# Altium footprint library Pin Header WR-PHD_2.00mm.PcbLib: 63 footprints (part 4 of 4)
Each footprint in its own frame and in the unit in brackets; x right, y up, seen from the top. Pads: shape width x height; smd on the part's side, far side on the other; paste and mask are expansions set on the pad; w line width, h text height; cw(c..) or ccw(c..) is an arc to the next point about the centre after c.
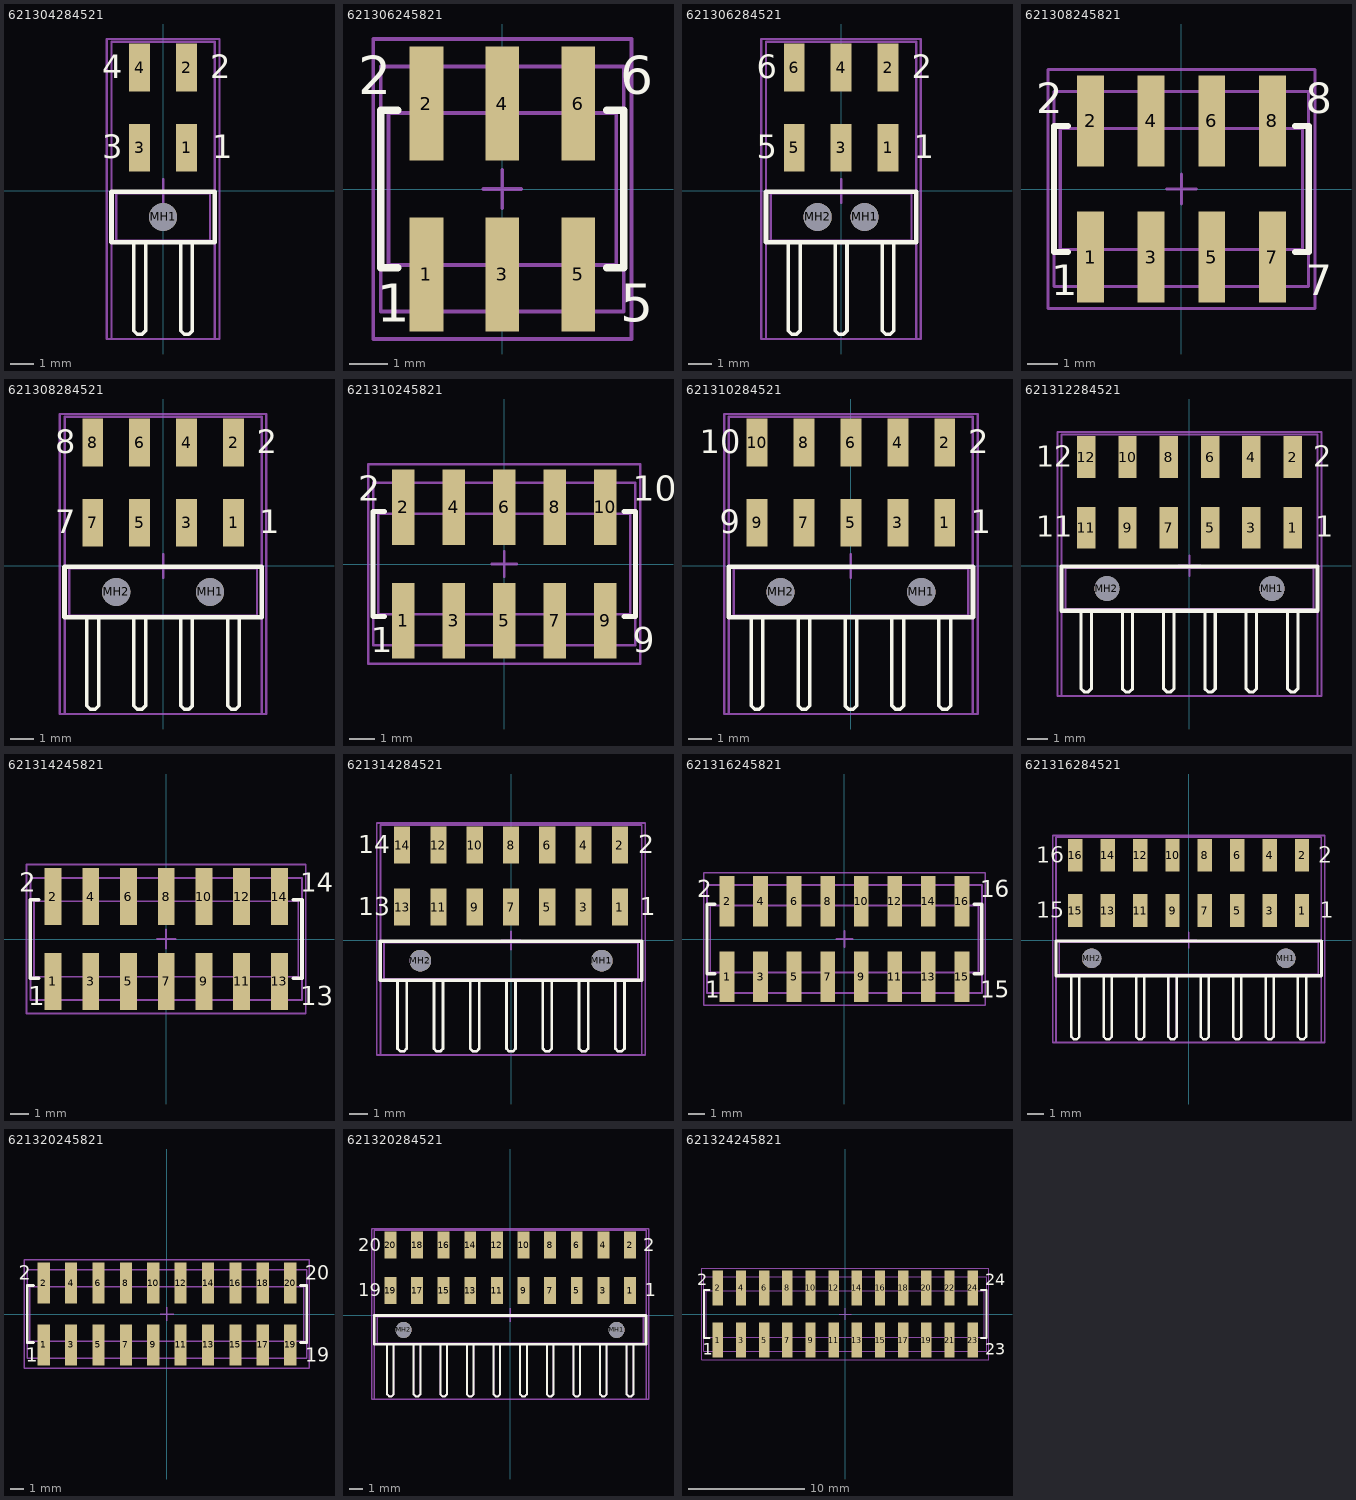
[diagram p3: the footprints below, top view; thin cyan lines are the x and y axes]

## 621304284521 [mm] "Pin Header, pitch 2.00 mm, SMD, Angled, dual row, 4p"
height 5.5
pads (5):
  rect 0.89x2.03 smd: 1(1,1.84) 2(1,5.26) 3(-1,1.84) 4(-1,5.26)
  round 1.2 hole 1.2 unplated: MH1(0,-1.11)
Top Overlay:
  lines w0.15: -1.25,-2.185 -1.25,-5.61 -1.25,-5.86 -1.25,-5.96 -1.1,-6.11 -0.9,-6.11 -0.75,-5.96 -0.75,-5.86 -0.75,-5.61 -0.75,-2.185 ; 0.75,-2.185 0.75,-5.61 0.75,-5.86 0.75,-5.96 0.9,-6.11 1.1,-6.11 1.25,-5.96 1.25,-5.86 1.25,-5.61 1.25,-2.185
  lines w0.2: -2.2,-2.185 -2.2,-0.035 2.2,-0.035 2.2,-2.185 -2.2,-2.185
  text "1" at 2.1,1.4 h1
  text "3" at -2.6,1.4 h1
  text "2" at 2,4.8 h1
  text "4" at -2.6,4.8 h1
Mechanical 11:
  lines w0.1: -1.25,-2.11 -1.25,-5.61 -1.25,-5.86 -1.25,-5.96 -1.1,-6.11 -0.9,-6.11 -0.75,-5.96 -0.75,-5.86 -0.75,-5.61 -0.75,-2.11 ; 0.75,-2.11 0.75,-5.61 0.75,-5.86 0.75,-5.96 0.9,-6.11 1.1,-6.11 1.25,-5.96 1.25,-5.86 1.25,-5.61 1.25,-2.11 ; -2,-2.11 2,-2.11 2,-0.11 -2,-0.11 -2,-2.11
Mechanical 13:
  lines w0.1: -2.2,-6.31 2.2,-6.31 2.2,6.36 -2.2,6.36 -2.2,-6.31
Mechanical 15:
  lines w0.1: -0.5,0 0.5,0 ; 0,-0.5 0,0.5 ; -2.4,-6.31 -2.4,6.475 2.4,6.475 2.4,-6.31 -2.4,-6.31
3D body "621304284521.stp": height 5.52, standoff -0.98, extent -3.75,-6.11 3.75,6.11

## 621306245821 [mm] "2.00 mm SMT Dual Pin Header Low Profile (Reel), 6p"
height 4.7
pads (6):
  rect 0.89x3 smd: 1(-2,-2.25) 2(-2,2.25) 3(0,-2.25) 4(0,2.25) 5(2,-2.25) 6(2,2.25)
Top Overlay:
  lines w0.2: -2.75,-2.075 -3.2,-2.075 -3.2,2.075 -2.75,2.075 ; 2.75,-2.075 3.2,-2.075 3.2,2.075 2.75,2.075
  text "5" at 3.1,-3.5 h1
  text "6" at 3.1,2.5 h1
  text "2" at -3.8,2.5 h1
  text "1" at -3.3,-3.5 h1
Mechanical 11:
  lines w0.1: -3,-2 -3,2 3,2 3,-2 -3,-2
Mechanical 13:
  lines w0.1: -3.2,-3.225 3.2,-3.225 3.2,3.225 -3.2,3.225 -3.2,-3.225
Mechanical 15:
  lines w0.1: -0.5,0 0.5,0 ; 0,-0.5 0,0.5 ; -3.4,-3.95 3.4,-3.95 3.4,3.95 -3.4,3.95 -3.4,-3.95
3D body "621306245821.stp": height 4.7, standoff 0, extent -3,-3.1 3,3.1

## 621306284521 [mm] "Pin Header, pitch 2.00 mm, SMD, Angled, dual row, 6p"
height 5.5
pads (8):
  rect 0.89x2.03 smd: 1(2,1.84) 2(2,5.26) 3(0,1.84) 4(0,5.26) 5(-2,1.84) 6(-2,5.26)
  round 1.2 hole 1.2 unplated: MH1(1,-1.11) MH2(-1,-1.11)
Top Overlay:
  lines w0.15: -2.25,-2.185 -2.25,-5.61 -2.25,-5.86 -2.25,-5.96 -2.1,-6.11 -1.9,-6.11 -1.75,-5.96 -1.75,-5.86 -1.75,-5.61 -1.75,-2.185 ; -0.25,-2.185 -0.25,-5.61 -0.25,-5.86 -0.25,-5.96 -0.1,-6.11 0.1,-6.11 0.25,-5.96 0.25,-5.86 0.25,-5.61 0.25,-2.185 ; 1.75,-2.185 1.75,-5.61 1.75,-5.86 1.75,-5.96 1.9,-6.11 2.1,-6.11 2.25,-5.96 2.25,-5.86 2.25,-5.61 2.25,-2.185
  lines w0.2: -3.2,-2.185 -3.2,-0.035 3.2,-0.035 3.2,-2.185 -3.2,-2.185
  text "5" at -3.6,1.4 h1
  text "6" at -3.6,4.8 h1
  text "1" at 3.1,1.4 h1
  text "2" at 3,4.8 h1
Mechanical 11:
  lines w0.1: -2.25,-2.11 -2.25,-5.61 -2.25,-5.86 -2.25,-5.96 -2.1,-6.11 -1.9,-6.11 -1.75,-5.96 -1.75,-5.86 -1.75,-5.61 -1.75,-2.11 ; -0.25,-2.11 -0.25,-5.61 -0.25,-5.86 -0.25,-5.96 -0.1,-6.11 0.1,-6.11 0.25,-5.96 0.25,-5.86 0.25,-5.61 0.25,-2.11 ; 1.75,-2.11 1.75,-5.61 1.75,-5.86 1.75,-5.96 1.9,-6.11 2.1,-6.11 2.25,-5.96 2.25,-5.86 2.25,-5.61 2.25,-2.11 ; -3,-2.11 3,-2.11 3,-0.11 -3,-0.11 -3,-2.11
Mechanical 13:
  lines w0.1: -3.2,-6.31 3.2,-6.31 3.2,6.36 -3.2,6.36 -3.2,-6.31
Mechanical 15:
  lines w0.1: -0.5,0 0.5,0 ; 0,-0.5 0,0.5 ; -3.4,-6.31 -3.4,6.475 3.4,6.475 3.4,-6.31 -3.4,-6.31
3D body "621306284521.stp": height 5.52, standoff -0.98, extent -3.75,-6.11 3.75,6.11

## 621308245821 [mm] "2.00 mm SMT Dual Pin Header Low Profile (Reel), 8p"
height 4.7
pads (8):
  rect 0.89x3 smd: 1(-3,-2.25) 2(-3,2.25) 3(-1,-2.25) 4(-1,2.25) 5(1,-2.25) 6(1,2.25) 7(3,-2.25) 8(3,2.25)
Top Overlay:
  lines w0.2: -3.75,-2.075 -4.2,-2.075 -4.2,2.075 -3.75,2.075 ; 3.75,-2.075 4.2,-2.075 4.2,2.075 3.75,2.075
  text "7" at 4.1,-3.5 h1
  text "8" at 4.1,2.5 h1
  text "2" at -4.8,2.5 h1
  text "1" at -4.3,-3.5 h1
Mechanical 11:
  lines w0.1: -4,-2 -4,2 4,2 4,-2 -4,-2
Mechanical 13:
  lines w0.1: -4.2,-3.225 4.2,-3.225 4.2,3.225 -4.2,3.225 -4.2,-3.225
Mechanical 15:
  lines w0.1: -0.5,0 0.5,0 ; 0,-0.5 0,0.5 ; -4.4,-3.95 4.4,-3.95 4.4,3.95 -4.4,3.95 -4.4,-3.95
3D body "621308245821.stp": height 4.7, standoff 0, extent -4,-3.1 4,3.1

## 621308284521 [mm] "Pin Header, pitch 2.00 mm, SMD, Angled, dual row, 8p"
height 5.5
pads (10):
  rect 0.89x2.03 smd: 1(3,1.84) 2(3,5.26) 3(1,1.84) 4(1,5.26) 5(-1,1.84) 6(-1,5.26) 7(-3,1.84) 8(-3,5.26)
  round 1.2 hole 1.2 unplated: MH1(2,-1.11) MH2(-2,-1.11)
Top Overlay:
  lines w0.15: -3.25,-2.185 -3.25,-5.61 -3.25,-5.86 -3.25,-5.96 -3.1,-6.11 -2.9,-6.11 -2.75,-5.96 -2.75,-5.86 -2.75,-5.61 -2.75,-2.185 ; -1.25,-2.185 -1.25,-5.61 -1.25,-5.86 -1.25,-5.96 -1.1,-6.11 -0.9,-6.11 -0.75,-5.96 -0.75,-5.86 -0.75,-5.61 -0.75,-2.185 ; 0.75,-2.185 0.75,-5.61 0.75,-5.86 0.75,-5.96 0.9,-6.11 1.1,-6.11 1.25,-5.96 1.25,-5.86 1.25,-5.61 1.25,-2.185 ; 2.75,-2.185 2.75,-5.61 2.75,-5.86 2.75,-5.96 2.9,-6.11 3.1,-6.11 3.25,-5.96 3.25,-5.86 3.25,-5.61 3.25,-2.185
  lines w0.2: -4.2,-2.185 -4.2,-0.035 4.2,-0.035 4.2,-2.185 -4.2,-2.185
  text "1" at 4.1,1.4 h1
  text "2" at 4,4.8 h1
  text "8" at -4.6,4.8 h1
  text "7" at -4.6,1.4 h1
Mechanical 11:
  lines w0.1: -3.25,-2.11 -3.25,-5.61 -3.25,-5.86 -3.25,-5.96 -3.1,-6.11 -2.9,-6.11 -2.75,-5.96 -2.75,-5.86 -2.75,-5.61 -2.75,-2.11 ; -1.25,-2.11 -1.25,-5.61 -1.25,-5.86 -1.25,-5.96 -1.1,-6.11 -0.9,-6.11 -0.75,-5.96 -0.75,-5.86 -0.75,-5.61 -0.75,-2.11 ; 0.75,-2.11 0.75,-5.61 0.75,-5.86 0.75,-5.96 0.9,-6.11 1.1,-6.11 1.25,-5.96 1.25,-5.86 1.25,-5.61 1.25,-2.11 ; 2.75,-2.11 2.75,-5.61 2.75,-5.86 2.75,-5.96 2.9,-6.11 3.1,-6.11 3.25,-5.96 3.25,-5.86 3.25,-5.61 3.25,-2.11 ; -4,-2.11 4,-2.11 4,-0.11 -4,-0.11 -4,-2.11
Mechanical 13:
  lines w0.1: -4.2,-6.31 4.2,-6.31 4.2,6.36 -4.2,6.36 -4.2,-6.31
Mechanical 15:
  lines w0.1: -0.5,0 0.5,0 ; 0,-0.5 0,0.5 ; -4.4,-6.31 -4.4,6.475 4.4,6.475 4.4,-6.31 -4.4,-6.31
3D body "621308284521.stp": height 5.52, standoff -0.98, extent -4,-6.11 4,6.11

## 621310245821 [mm] "2.00 mm SMT Dual Pin Header Low Profile (Reel), 10p"
height 4.7
pads (10):
  rect 0.89x3 smd: 1(-4,-2.25) 2(-4,2.25) 3(-2,-2.25) 4(-2,2.25) 5(0,-2.25) 6(0,2.25) 7(2,-2.25) 8(2,2.25) 9(4,-2.25) 10(4,2.25)
Top Overlay:
  lines w0.2: -4.75,-2.075 -5.2,-2.075 -5.2,2.075 -4.75,2.075 ; 4.75,-2.075 5.2,-2.075 5.2,2.075 4.75,2.075
  text "2" at -5.8,2.5 h1
  text "1" at -5.3,-3.5 h1
  text "10" at 5.1,2.5 h1
  text "9" at 5.1,-3.5 h1
Mechanical 11:
  lines w0.1: -5,-2 -5,2 5,2 5,-2 -5,-2
Mechanical 13:
  lines w0.1: -5.2,-3.225 5.2,-3.225 5.2,3.225 -5.2,3.225 -5.2,-3.225
Mechanical 15:
  lines w0.1: -0.5,0 0.5,0 ; 0,-0.5 0,0.5 ; -5.4,-3.95 5.4,-3.95 5.4,3.95 -5.4,3.95 -5.4,-3.95
3D body "621310245821.stp": height 4.7, standoff 0, extent -5,-3.1 5,3.1

## 621310284521 [mm] "Pin Header, pitch 2.00 mm, SMD, Angled, dual row, 10p"
height 5.5
pads (12):
  rect 0.89x2.03 smd: 1(4,1.84) 2(4,5.26) 3(2,1.84) 4(2,5.26) 5(0,1.84) 6(0,5.26) 7(-2,1.84) 8(-2,5.26) 9(-4,1.84) 10(-4,5.26)
  round 1.2 hole 1.2 unplated: MH1(3,-1.11) MH2(-3,-1.11)
Top Overlay:
  lines w0.15: -4.25,-2.185 -4.25,-5.61 -4.25,-5.86 -4.25,-5.96 -4.1,-6.11 -3.9,-6.11 -3.75,-5.96 -3.75,-5.86 -3.75,-5.61 -3.75,-2.185 ; -2.25,-2.185 -2.25,-5.61 -2.25,-5.86 -2.25,-5.96 -2.1,-6.11 -1.9,-6.11 -1.75,-5.96 -1.75,-5.86 -1.75,-5.61 -1.75,-2.185 ; -0.25,-2.185 -0.25,-5.61 -0.25,-5.86 -0.25,-5.96 -0.1,-6.11 0.1,-6.11 0.25,-5.96 0.25,-5.86 0.25,-5.61 0.25,-2.185 ; 1.75,-2.185 1.75,-5.61 1.75,-5.86 1.75,-5.96 1.9,-6.11 2.1,-6.11 2.25,-5.96 2.25,-5.86 2.25,-5.61 2.25,-2.185 ; 3.75,-2.185 3.75,-5.61 3.75,-5.86 3.75,-5.96 3.9,-6.11 4.1,-6.11 4.25,-5.96 4.25,-5.86 4.25,-5.61 4.25,-2.185
  lines w0.2: -5.2,-2.185 -5.2,-0.035 5.2,-0.035 5.2,-2.185 -5.2,-2.185
  text "1" at 5.1,1.4 h1
  text "2" at 5,4.8 h1
  text "10" at -6.433,4.8 h1
  text "9" at -5.6,1.4 h1
Mechanical 11:
  lines w0.1: -4.25,-2.11 -4.25,-5.61 -4.25,-5.86 -4.25,-5.96 -4.1,-6.11 -3.9,-6.11 -3.75,-5.96 -3.75,-5.86 -3.75,-5.61 -3.75,-2.11 ; -2.25,-2.11 -2.25,-5.61 -2.25,-5.86 -2.25,-5.96 -2.1,-6.11 -1.9,-6.11 -1.75,-5.96 -1.75,-5.86 -1.75,-5.61 -1.75,-2.11 ; -0.25,-2.11 -0.25,-5.61 -0.25,-5.86 -0.25,-5.96 -0.1,-6.11 0.1,-6.11 0.25,-5.96 0.25,-5.86 0.25,-5.61 0.25,-2.11 ; 1.75,-2.11 1.75,-5.61 1.75,-5.86 1.75,-5.96 1.9,-6.11 2.1,-6.11 2.25,-5.96 2.25,-5.86 2.25,-5.61 2.25,-2.11 ; 3.75,-2.11 3.75,-5.61 3.75,-5.86 3.75,-5.96 3.9,-6.11 4.1,-6.11 4.25,-5.96 4.25,-5.86 4.25,-5.61 4.25,-2.11 ; -5,-2.11 5,-2.11 5,-0.11 -5,-0.11 -5,-2.11
Mechanical 13:
  lines w0.1: -5.2,-6.31 5.2,-6.31 5.2,6.36 -5.2,6.36 -5.2,-6.31
Mechanical 15:
  lines w0.1: -0.5,0 0.5,0 ; 0,-0.5 0,0.5 ; -5.4,-6.31 -5.4,6.475 5.4,6.475 5.4,-6.31 -5.4,-6.31
3D body "621310284521.stp": height 5.52, standoff -0.98, extent -5,-6.11 5,6.11

## 621312284521 [mm] "Pin Header, pitch 2.00 mm, SMD, Angled, dual row, 12p"
height 5.5
pads (14):
  rect 0.89x2.03 smd: 1(5,1.84) 2(5,5.26) 3(3,1.84) 4(3,5.26) 5(1,1.84) 6(1,5.26) 7(-1,1.84) 8(-1,5.26) 9(-3,1.84) 10(-3,5.26) 11(-5,1.84) 12(-5,5.26)
  round 1.2 hole 1.2 unplated: MH1(4,-1.11) MH2(-4,-1.11)
Top Overlay:
  lines w0.15: -5.25,-2.185 -5.25,-5.61 -5.25,-5.86 -5.25,-5.96 -5.1,-6.11 -4.9,-6.11 -4.75,-5.96 -4.75,-5.86 -4.75,-5.61 -4.75,-2.185 ; -3.25,-2.185 -3.25,-5.61 -3.25,-5.86 -3.25,-5.96 -3.1,-6.11 -2.9,-6.11 -2.75,-5.96 -2.75,-5.86 -2.75,-5.61 -2.75,-2.185 ; -1.25,-2.185 -1.25,-5.61 -1.25,-5.86 -1.25,-5.96 -1.1,-6.11 -0.9,-6.11 -0.75,-5.96 -0.75,-5.86 -0.75,-5.61 -0.75,-2.185 ; 0.75,-2.185 0.75,-5.61 0.75,-5.86 0.75,-5.96 0.9,-6.11 1.1,-6.11 1.25,-5.96 1.25,-5.86 1.25,-5.61 1.25,-2.185 ; 2.75,-2.185 2.75,-5.61 2.75,-5.86 2.75,-5.96 2.9,-6.11 3.1,-6.11 3.25,-5.96 3.25,-5.86 3.25,-5.61 3.25,-2.185 ; 4.75,-2.185 4.75,-5.61 4.75,-5.86 4.75,-5.96 4.9,-6.11 5.1,-6.11 5.25,-5.96 5.25,-5.86 5.25,-5.61 5.25,-2.185
  lines w0.2: -6.2,-2.185 -6.2,-0.035 6.2,-0.035 6.2,-2.185 -6.2,-2.185
  text "1" at 6.1,1.4 h1
  text "2" at 6,4.8 h1
  text "11" at -7.433,1.4 h1
  text "12" at -7.433,4.8 h1
Mechanical 11:
  lines w0.1: -5.25,-2.11 -5.25,-5.61 -5.25,-5.86 -5.25,-5.96 -5.1,-6.11 -4.9,-6.11 -4.75,-5.96 -4.75,-5.86 -4.75,-5.61 -4.75,-2.11 ; -3.25,-2.11 -3.25,-5.61 -3.25,-5.86 -3.25,-5.96 -3.1,-6.11 -2.9,-6.11 -2.75,-5.96 -2.75,-5.86 -2.75,-5.61 -2.75,-2.11 ; -1.25,-2.11 -1.25,-5.61 -1.25,-5.86 -1.25,-5.96 -1.1,-6.11 -0.9,-6.11 -0.75,-5.96 -0.75,-5.86 -0.75,-5.61 -0.75,-2.11 ; 0.75,-2.11 0.75,-5.61 0.75,-5.86 0.75,-5.96 0.9,-6.11 1.1,-6.11 1.25,-5.96 1.25,-5.86 1.25,-5.61 1.25,-2.11 ; 2.75,-2.11 2.75,-5.61 2.75,-5.86 2.75,-5.96 2.9,-6.11 3.1,-6.11 3.25,-5.96 3.25,-5.86 3.25,-5.61 3.25,-2.11 ; 4.75,-2.11 4.75,-5.61 4.75,-5.86 4.75,-5.96 4.9,-6.11 5.1,-6.11 5.25,-5.96 5.25,-5.86 5.25,-5.61 5.25,-2.11 ; -6,-2.11 6,-2.11 6,-0.11 -6,-0.11 -6,-2.11
Mechanical 13:
  lines w0.1: -6.2,-6.31 6.2,-6.31 6.2,6.36 -6.2,6.36 -6.2,-6.31
Mechanical 15:
  lines w0.1: -0.5,0 0.5,0 ; 0,-0.5 0,0.5 ; -6.4,-6.31 -6.4,6.475 6.4,6.475 6.4,-6.31 -6.4,-6.31
3D body "621312284521.stp": height 5.52, standoff -0.98, extent -6,-6.11 6,6.11

## 621314245821 [mm] "2.00 mm SMT Dual Pin Header Low Profile (Reel), 14p"
height 4.7
pads (14):
  rect 0.89x3 smd: 1(-6,-2.25) 2(-6,2.25) 3(-4,-2.25) 4(-4,2.25) 5(-2,-2.25) 6(-2,2.25) 7(0,-2.25) 8(0,2.25) 9(2,-2.25) 10(2,2.25) 11(4,-2.25) 12(4,2.25) 13(6,-2.25) 14(6,2.25)
Top Overlay:
  lines w0.2: -6.75,-2.075 -7.2,-2.075 -7.2,2.075 -6.75,2.075 ; 6.75,-2.075 7.2,-2.075 7.2,2.075 6.75,2.075
  text "13" at 7.1,-3.5 h1
  text "14" at 7.1,2.5 h1
  text "1" at -7.3,-3.5 h1
  text "2" at -7.8,2.5 h1
Mechanical 11:
  lines w0.1: -7,-2 7,-2 7,2 -7,2 -7,-2
Mechanical 13:
  lines w0.1: -7.2,-3.225 -7.2,3.225 7.2,3.225 7.2,-3.225 -7.2,-3.225
Mechanical 15:
  lines w0.1: -0.5,0 0.5,0 ; 0,-0.5 0,0.5 ; -7.4,-3.95 -7.4,3.95 7.4,3.95 7.4,-3.95 -7.4,-3.95
3D body "621314245821.stp": height 4.7, standoff 0, extent -7,-3.1 7,3.1

## 621314284521 [mm] "Pin Header, pitch 2.00 mm, SMD, Angled, dual row, 14p"
height 5.5
pads (16):
  rect 0.89x2.03 smd: 1(6,1.84) 2(6,5.26) 3(4,1.84) 4(4,5.26) 5(2,1.84) 6(2,5.26) 7(0,1.84) 8(0,5.26) 9(-2,1.84) 10(-2,5.26) 11(-4,1.84) 12(-4,5.26) 13(-6,1.84) 14(-6,5.26)
  round 1.2 hole 1.2 unplated: MH1(5,-1.11) MH2(-5,-1.11)
Top Overlay:
  lines w0.15: -6.25,-2.185 -6.25,-5.61 -6.25,-5.86 -6.25,-5.96 -6.1,-6.11 -5.9,-6.11 -5.75,-5.96 -5.75,-5.86 -5.75,-5.61 -5.75,-2.185 ; -4.25,-2.185 -4.25,-5.61 -4.25,-5.86 -4.25,-5.96 -4.1,-6.11 -3.9,-6.11 -3.75,-5.96 -3.75,-5.86 -3.75,-5.61 -3.75,-2.185 ; -2.25,-2.185 -2.25,-5.61 -2.25,-5.86 -2.25,-5.96 -2.1,-6.11 -1.9,-6.11 -1.75,-5.96 -1.75,-5.86 -1.75,-5.61 -1.75,-2.185 ; -0.25,-2.185 -0.25,-5.61 -0.25,-5.86 -0.25,-5.96 -0.1,-6.11 0.1,-6.11 0.25,-5.96 0.25,-5.86 0.25,-5.61 0.25,-2.185 ; 1.75,-2.185 1.75,-5.61 1.75,-5.86 1.75,-5.96 1.9,-6.11 2.1,-6.11 2.25,-5.96 2.25,-5.86 2.25,-5.61 2.25,-2.185 ; 3.75,-2.185 3.75,-5.61 3.75,-5.86 3.75,-5.96 3.9,-6.11 4.1,-6.11 4.25,-5.96 4.25,-5.86 4.25,-5.61 4.25,-2.185 ; 5.75,-2.185 5.75,-5.61 5.75,-5.86 5.75,-5.96 5.9,-6.11 6.1,-6.11 6.25,-5.96 6.25,-5.86 6.25,-5.61 6.25,-2.185
  lines w0.2: -7.2,-2.185 7.2,-2.185 7.2,-0.035 -7.2,-0.035 -7.2,-2.185
  text "13" at -8.433,1.4 h1
  text "14" at -8.433,4.8 h1
  text "2" at 7,4.8 h1
  text "1" at 7.1,1.4 h1
Mechanical 11:
  lines w0.1: -6.25,-2.11 -6.25,-5.61 -6.25,-5.86 -6.25,-5.96 -6.1,-6.11 -5.9,-6.11 -5.75,-5.96 -5.75,-5.86 -5.75,-5.61 -5.75,-2.11 ; -4.25,-2.11 -4.25,-5.61 -4.25,-5.86 -4.25,-5.96 -4.1,-6.11 -3.9,-6.11 -3.75,-5.96 -3.75,-5.86 -3.75,-5.61 -3.75,-2.11 ; -2.25,-2.11 -2.25,-5.61 -2.25,-5.86 -2.25,-5.96 -2.1,-6.11 -1.9,-6.11 -1.75,-5.96 -1.75,-5.86 -1.75,-5.61 -1.75,-2.11 ; -0.25,-2.11 -0.25,-5.61 -0.25,-5.86 -0.25,-5.96 -0.1,-6.11 0.1,-6.11 0.25,-5.96 0.25,-5.86 0.25,-5.61 0.25,-2.11 ; 1.75,-2.11 1.75,-5.61 1.75,-5.86 1.75,-5.96 1.9,-6.11 2.1,-6.11 2.25,-5.96 2.25,-5.86 2.25,-5.61 2.25,-2.11 ; 3.75,-2.11 3.75,-5.61 3.75,-5.86 3.75,-5.96 3.9,-6.11 4.1,-6.11 4.25,-5.96 4.25,-5.86 4.25,-5.61 4.25,-2.11 ; 5.75,-2.11 5.75,-5.61 5.75,-5.86 5.75,-5.96 5.9,-6.11 6.1,-6.11 6.25,-5.96 6.25,-5.86 6.25,-5.61 6.25,-2.11 ; -7,-2.11 -7,-0.11 7,-0.11 7,-2.11 -7,-2.11
Mechanical 13:
  lines w0.1: -7.2,-6.31 -7.2,6.36 7.2,6.36 7.2,-6.31 -7.2,-6.31
Mechanical 15:
  lines w0.1: -0.5,0 0.5,0 ; 0,-0.5 0,0.5 ; -7.4,-6.31 7.4,-6.31 7.4,6.475 -7.4,6.475 -7.4,-6.31
3D body "621314284521.stp": height 5.52, standoff -0.98, extent -7,-6.11 7,6.11

## 621316245821 [mm] "2.00 mm SMT Dual Pin Header Low Profile (Reel), 16p"
height 4.7
pads (16):
  rect 0.89x3 smd: 1(-7,-2.25) 2(-7,2.25) 3(-5,-2.25) 4(-5,2.25) 5(-3,-2.25) 6(-3,2.25) 7(-1,-2.25) 8(-1,2.25) 9(1,-2.25) 10(1,2.25) 11(3,-2.25) 12(3,2.25) 13(5,-2.25) 14(5,2.25) 15(7,-2.25) 16(7,2.25)
Top Overlay:
  lines w0.2: -7.75,-2.075 -8.2,-2.075 -8.2,2.075 -7.75,2.075 ; 7.75,-2.075 8.2,-2.075 8.2,2.075 7.75,2.075
  text "15" at 8.1,-3.5 h1
  text "16" at 8.1,2.5 h1
  text "1" at -8.3,-3.5 h1
  text "2" at -8.8,2.5 h1
Mechanical 11:
  lines w0.1: -8,-2 8,-2 8,2 -8,2 -8,-2
Mechanical 13:
  lines w0.1: -8.2,-3.225 -8.2,3.225 8.2,3.225 8.2,-3.225 -8.2,-3.225
Mechanical 15:
  lines w0.1: -0.5,0 0.5,0 ; 0,-0.5 0,0.5 ; -8.4,-3.95 -8.4,3.95 8.4,3.95 8.4,-3.95 -8.4,-3.95
3D body "621316245821.stp": height 4.7, standoff 0, extent -8,-3.1 8,3.1

## 621316284521 [mm] "Pin Header, pitch 2.00 mm, SMD, Angled, dual row, 16p"
height 5.5
pads (18):
  rect 0.89x2.03 smd: 1(7,1.84) 2(7,5.26) 3(5,1.84) 4(5,5.26) 5(3,1.84) 6(3,5.26) 7(1,1.84) 8(1,5.26) 9(-1,1.84) 10(-1,5.26) 11(-3,1.84) 12(-3,5.26) 13(-5,1.84) 14(-5,5.26) 15(-7,1.84) 16(-7,5.26)
  round 1.2 hole 1.2 unplated: MH1(6,-1.11) MH2(-6,-1.11)
Top Overlay:
  lines w0.15: -7.25,-2.185 -7.25,-5.61 -7.25,-5.86 -7.25,-5.96 -7.1,-6.11 -6.9,-6.11 -6.75,-5.96 -6.75,-5.86 -6.75,-5.61 -6.75,-2.185 ; -5.25,-2.185 -5.25,-5.61 -5.25,-5.86 -5.25,-5.96 -5.1,-6.11 -4.9,-6.11 -4.75,-5.96 -4.75,-5.86 -4.75,-5.61 -4.75,-2.185 ; -3.25,-2.185 -3.25,-5.61 -3.25,-5.86 -3.25,-5.96 -3.1,-6.11 -2.9,-6.11 -2.75,-5.96 -2.75,-5.86 -2.75,-5.61 -2.75,-2.185 ; -1.25,-2.185 -1.25,-5.61 -1.25,-5.86 -1.25,-5.96 -1.1,-6.11 -0.9,-6.11 -0.75,-5.96 -0.75,-5.86 -0.75,-5.61 -0.75,-2.185 ; 0.75,-2.185 0.75,-5.61 0.75,-5.86 0.75,-5.96 0.9,-6.11 1.1,-6.11 1.25,-5.96 1.25,-5.86 1.25,-5.61 1.25,-2.185 ; 2.75,-2.185 2.75,-5.61 2.75,-5.86 2.75,-5.96 2.9,-6.11 3.1,-6.11 3.25,-5.96 3.25,-5.86 3.25,-5.61 3.25,-2.185 ; 4.75,-2.185 4.75,-5.61 4.75,-5.86 4.75,-5.96 4.9,-6.11 5.1,-6.11 5.25,-5.96 5.25,-5.86 5.25,-5.61 5.25,-2.185 ; 6.75,-2.185 6.75,-5.61 6.75,-5.86 6.75,-5.96 6.9,-6.11 7.1,-6.11 7.25,-5.96 7.25,-5.86 7.25,-5.61 7.25,-2.185
  lines w0.2: -8.2,-2.185 8.2,-2.185 8.2,-0.035 -8.2,-0.035 -8.2,-2.185
  text "15" at -9.433,1.4 h1
  text "16" at -9.433,4.8 h1
  text "2" at 8,4.8 h1
  text "1" at 8.1,1.4 h1
Mechanical 11:
  lines w0.1: -7.25,-2.11 -7.25,-5.61 -7.25,-5.86 -7.25,-5.96 -7.1,-6.11 -6.9,-6.11 -6.75,-5.96 -6.75,-5.86 -6.75,-5.61 -6.75,-2.11 ; -5.25,-2.11 -5.25,-5.61 -5.25,-5.86 -5.25,-5.96 -5.1,-6.11 -4.9,-6.11 -4.75,-5.96 -4.75,-5.86 -4.75,-5.61 -4.75,-2.11 ; -3.25,-2.11 -3.25,-5.61 -3.25,-5.86 -3.25,-5.96 -3.1,-6.11 -2.9,-6.11 -2.75,-5.96 -2.75,-5.86 -2.75,-5.61 -2.75,-2.11 ; -1.25,-2.11 -1.25,-5.61 -1.25,-5.86 -1.25,-5.96 -1.1,-6.11 -0.9,-6.11 -0.75,-5.96 -0.75,-5.86 -0.75,-5.61 -0.75,-2.11 ; 0.75,-2.11 0.75,-5.61 0.75,-5.86 0.75,-5.96 0.9,-6.11 1.1,-6.11 1.25,-5.96 1.25,-5.86 1.25,-5.61 1.25,-2.11 ; 2.75,-2.11 2.75,-5.61 2.75,-5.86 2.75,-5.96 2.9,-6.11 3.1,-6.11 3.25,-5.96 3.25,-5.86 3.25,-5.61 3.25,-2.11 ; 4.75,-2.11 4.75,-5.61 4.75,-5.86 4.75,-5.96 4.9,-6.11 5.1,-6.11 5.25,-5.96 5.25,-5.86 5.25,-5.61 5.25,-2.11 ; 6.75,-2.11 6.75,-5.61 6.75,-5.86 6.75,-5.96 6.9,-6.11 7.1,-6.11 7.25,-5.96 7.25,-5.86 7.25,-5.61 7.25,-2.11 ; -8,-2.11 -8,-0.11 8,-0.11 8,-2.11 -8,-2.11
Mechanical 13:
  lines w0.1: -8.2,-6.31 -8.2,6.36 8.2,6.36 8.2,-6.31 -8.2,-6.31
Mechanical 15:
  lines w0.1: -0.5,0 0.5,0 ; 0,-0.5 0,0.5 ; -8.4,-6.31 8.4,-6.31 8.4,6.475 -8.4,6.475 -8.4,-6.31
3D body "621316284521.stp": height 5.52, standoff -0.98, extent -8,-6.11 8,6.11

## 621320245821 [mm] "2.00 mm SMT Dual Pin Header Low Profile (Reel), 20p"
height 4.7
pads (20):
  rect 0.89x3 smd: 1(-9,-2.25) 2(-9,2.25) 3(-7,-2.25) 4(-7,2.25) 5(-5,-2.25) 6(-5,2.25) 7(-3,-2.25) 8(-3,2.25) 9(-1,-2.25) 10(-1,2.25) 11(1,-2.25) 12(1,2.25) 13(3,-2.25) 14(3,2.25) 15(5,-2.25) 16(5,2.25) 17(7,-2.25) 18(7,2.25) 19(9,-2.25) 20(9,2.25)
Top Overlay:
  lines w0.2: -9.75,-2.075 -10.2,-2.075 -10.2,2.075 -9.75,2.075 ; 9.75,-2.075 10.2,-2.075 10.2,2.075 9.75,2.075
  text "19" at 10.1,-3.5 h1
  text "20" at 10.1,2.5 h1
  text "2" at -10.8,2.5 h1
  text "1" at -10.3,-3.5 h1
Mechanical 11:
  lines w0.1: -10,-2 -10,2 10,2 10,-2 -10,-2
Mechanical 13:
  lines w0.1: -10.2,-3.225 10.2,-3.225 10.2,3.225 -10.2,3.225 -10.2,-3.225
Mechanical 15:
  lines w0.1: -0.5,0 0.5,0 ; 0,-0.5 0,0.5 ; -10.4,-3.95 10.4,-3.95 10.4,3.95 -10.4,3.95 -10.4,-3.95
3D body "621320245821.stp": height 4.7, standoff 0, extent -10,-3.1 10,3.1

## 621320284521 [mm] "Pin Header, pitch 2.00 mm, SMD, Angled, dual row, 20p"
height 5.5
pads (22):
  rect 0.89x2.03 smd: 1(9,1.84) 2(9,5.26) 3(7,1.84) 4(7,5.26) 5(5,1.84) 6(5,5.26) 7(3,1.84) 8(3,5.26) 9(1,1.84) 10(1,5.26) 11(-1,1.84) 12(-1,5.26) 13(-3,1.84) 14(-3,5.26) 15(-5,1.84) 16(-5,5.26) 17(-7,1.84) 18(-7,5.26) 19(-9,1.84) 20(-9,5.26)
  round 1.2 hole 1.2 unplated: MH1(8,-1.11) MH2(-8,-1.11)
Top Overlay:
  lines w0.15: -9.25,-2.185 -9.25,-5.61 -9.25,-5.86 -9.25,-5.96 -9.1,-6.11 -8.9,-6.11 -8.75,-5.96 -8.75,-5.86 -8.75,-5.61 -8.75,-2.185 ; -7.25,-2.185 -7.25,-5.61 -7.25,-5.86 -7.25,-5.96 -7.1,-6.11 -6.9,-6.11 -6.75,-5.96 -6.75,-5.86 -6.75,-5.61 -6.75,-2.185 ; -5.25,-2.185 -5.25,-5.61 -5.25,-5.86 -5.25,-5.96 -5.1,-6.11 -4.9,-6.11 -4.75,-5.96 -4.75,-5.86 -4.75,-5.61 -4.75,-2.185 ; -3.25,-2.185 -3.25,-5.61 -3.25,-5.86 -3.25,-5.96 -3.1,-6.11 -2.9,-6.11 -2.75,-5.96 -2.75,-5.86 -2.75,-5.61 -2.75,-2.185 ; -1.25,-2.185 -1.25,-5.61 -1.25,-5.86 -1.25,-5.96 -1.1,-6.11 -0.9,-6.11 -0.75,-5.96 -0.75,-5.86 -0.75,-5.61 -0.75,-2.185 ; 0.75,-2.185 0.75,-5.61 0.75,-5.86 0.75,-5.96 0.9,-6.11 1.1,-6.11 1.25,-5.96 1.25,-5.86 1.25,-5.61 1.25,-2.185 ; 2.75,-2.185 2.75,-5.61 2.75,-5.86 2.75,-5.96 2.9,-6.11 3.1,-6.11 3.25,-5.96 3.25,-5.86 3.25,-5.61 3.25,-2.185 ; 4.75,-2.185 4.75,-5.61 4.75,-5.86 4.75,-5.96 4.9,-6.11 5.1,-6.11 5.25,-5.96 5.25,-5.86 5.25,-5.61 5.25,-2.185 ; 6.75,-2.185 6.75,-5.61 6.75,-5.86 6.75,-5.96 6.9,-6.11 7.1,-6.11 7.25,-5.96 7.25,-5.86 7.25,-5.61 7.25,-2.185 ; 8.75,-2.185 8.75,-5.61 8.75,-5.86 8.75,-5.96 8.9,-6.11 9.1,-6.11 9.25,-5.96 9.25,-5.86 9.25,-5.61 9.25,-2.185
  lines w0.2: -10.2,-2.185 10.2,-2.185 10.2,-0.035 -10.2,-0.035 -10.2,-2.185
  text "19" at -11.433,1.4 h1
  text "20" at -11.433,4.8 h1
  text "2" at 10,4.8 h1
  text "1" at 10.1,1.4 h1
Mechanical 11:
  lines w0.1: -9.25,-2.11 -9.25,-5.61 -9.25,-5.86 -9.25,-5.96 -9.1,-6.11 -8.9,-6.11 -8.75,-5.96 -8.75,-5.86 -8.75,-5.61 -8.75,-2.11 ; -7.25,-2.11 -7.25,-5.61 -7.25,-5.86 -7.25,-5.96 -7.1,-6.11 -6.9,-6.11 -6.75,-5.96 -6.75,-5.86 -6.75,-5.61 -6.75,-2.11 ; -5.25,-2.11 -5.25,-5.61 -5.25,-5.86 -5.25,-5.96 -5.1,-6.11 -4.9,-6.11 -4.75,-5.96 -4.75,-5.86 -4.75,-5.61 -4.75,-2.11 ; -3.25,-2.11 -3.25,-5.61 -3.25,-5.86 -3.25,-5.96 -3.1,-6.11 -2.9,-6.11 -2.75,-5.96 -2.75,-5.86 -2.75,-5.61 -2.75,-2.11 ; -1.25,-2.11 -1.25,-5.61 -1.25,-5.86 -1.25,-5.96 -1.1,-6.11 -0.9,-6.11 -0.75,-5.96 -0.75,-5.86 -0.75,-5.61 -0.75,-2.11 ; 0.75,-2.11 0.75,-5.61 0.75,-5.86 0.75,-5.96 0.9,-6.11 1.1,-6.11 1.25,-5.96 1.25,-5.86 1.25,-5.61 1.25,-2.11 ; 2.75,-2.11 2.75,-5.61 2.75,-5.86 2.75,-5.96 2.9,-6.11 3.1,-6.11 3.25,-5.96 3.25,-5.86 3.25,-5.61 3.25,-2.11 ; 4.75,-2.11 4.75,-5.61 4.75,-5.86 4.75,-5.96 4.9,-6.11 5.1,-6.11 5.25,-5.96 5.25,-5.86 5.25,-5.61 5.25,-2.11 ; 6.75,-2.11 6.75,-5.61 6.75,-5.86 6.75,-5.96 6.9,-6.11 7.1,-6.11 7.25,-5.96 7.25,-5.86 7.25,-5.61 7.25,-2.11 ; 8.75,-2.11 8.75,-5.61 8.75,-5.86 8.75,-5.96 8.9,-6.11 9.1,-6.11 9.25,-5.96 9.25,-5.86 9.25,-5.61 9.25,-2.11 ; -10,-2.11 -10,-0.11 10,-0.11 10,-2.11 -10,-2.11
Mechanical 13:
  lines w0.1: -10.2,-6.31 -10.2,6.36 10.2,6.36 10.2,-6.31 -10.2,-6.31
Mechanical 15:
  lines w0.1: -0.5,0 0.5,0 ; 0,-0.5 0,0.5 ; -10.4,-6.31 10.4,-6.31 10.4,6.475 -10.4,6.475 -10.4,-6.31
3D body "621320284521.stp": height 5.52, standoff -0.98, extent -10,-6.11 10,6.11

## 621324245821 [mm] "2.00 mm SMT Dual Pin Header Low Profile (Reel), 24p"
height 4.7
pads (24):
  rect 0.89x3 smd: 1(-11,-2.25) 2(-11,2.25) 3(-9,-2.25) 4(-9,2.25) 5(-7,-2.25) 6(-7,2.25) 7(-5,-2.25) 8(-5,2.25) 9(-3,-2.25) 10(-3,2.25) 11(-1,-2.25) 12(-1,2.25) 13(1,-2.25) 14(1,2.25) 15(3,-2.25) 16(3,2.25) 17(5,-2.25) 18(5,2.25) 19(7,-2.25) 20(7,2.25) 21(9,-2.25) 22(9,2.25) 23(11,-2.25) 24(11,2.25)
Top Overlay:
  lines w0.2: -11.75,-2.075 -12.2,-2.075 -12.2,2.075 -11.75,2.075 ; 11.75,-2.075 12.2,-2.075 12.2,2.075 11.75,2.075
  text "23" at 12.1,-3.5 h1
  text "24" at 12.1,2.5 h1
  text "1" at -12.3,-3.5 h1
  text "2" at -12.8,2.5 h1
Mechanical 11:
  lines w0.1: -12,-2 12,-2 12,2 -12,2 -12,-2
Mechanical 13:
  lines w0.1: -12.2,-3.225 -12.2,3.225 12.2,3.225 12.2,-3.225 -12.2,-3.225
Mechanical 15:
  lines w0.1: -0.5,0 0.5,0 ; 0,-0.5 0,0.5 ; -12.4,-3.95 -12.4,3.95 12.4,3.95 12.4,-3.95 -12.4,-3.95
3D body "621324245821.stp": height 4.7, standoff 0, extent -12,-3.1 12,3.1